# Altium schematic symbol library IC_TI.SCHLIB: 1162 symbols (part 3 of 8) (continued)
## LT1013DDR (continued)

## LT3507AEFE#PBF
designator U?
Integrated Circuit; Manufacturer_Name: Linear Technology; Manufacturer_Part_Number: LT3507AEFE#PBF; Datasheet Link: http://cds.linear.com/docs/en/datasheet/3507af.pdf; Height: 1.2mm; Mouser Part Number: 584-LT3507AEFE#PBF; Mouser Price/Stock: https://www.mouser.com/Search/Refine.aspx?Keyword=584-LT3507AEFE%23PBF
footprint TSSOP38_0.5-PAD
pins: 1 VIN3 (in), 2 SW1_1, 3 SW1_2, 4 BOOST1, 5 VIN1_1 (in), 6 VIN1_2 (in), 7 VINSW (in), 8 OVLO, 9 UVLO, 10 VC1, 11 TRK/SS1, 12 FB1, 13 PG0OD1, 14 PG0OD2, 15 PG0OD3, 16 RT/SYNC, 17 RUN1, 18 RUN2, 19 RUN3, 20 GND (power), 21 BIAS, 22 TRK/SS3, 23 VC3, 24 FB3, 25 TRK/SS2, 26 FB2, 27 NC_1, 28 VC2, 29 DRIVE, 30 FB4, 31 TRK/SS4, 32 BOOST2, 33 SW2, 34 NC_2, 35 VIN2_1 (in), 36 VIN2_2 (in), 37 BOOST3, 38 SW3, 39 EP (power)

## LT8582EDKD#TRPBF
designator U?
Integrated Circuit; Manufacturer_Name: Linear Technology; Manufacturer_Part_Number: LT8582EDKD#TRPBF; Datasheet Link: http://www.analog.com/media/en/technical-documentation/data-sheets/8582f.pdf; Height: 0.8mm; Mouser Part Number: 584-LT8582EDKD#TRPBF; Mouser Price/Stock: https://www.mouser.com/Search/Refine.aspx?Keyword=584-LT8582EDKD%23TRPBF
footprint DFN24_0.5-PAD(7X4)
pins: 1 SWA1, 2 VIN1, 3 PG1, 4 GATE1, 5 VC1, 6 FBX1, 7 FBX2, 8 VC2, 9 GATE2, 10 PG2, 11 VIN2, 12 SWA2, 13 SWB2, 14 CLKOUT2, 15 ~{SHDN2}, 16 RT2, 17 SS2, 18 SYNC2, 19 SYNC1, 20 SS1, 21 RT1, 22 ~{SHDN1}, 23 CLKOUT1, 24 SWB1, 25 EP_(GND)

## MAX232EIDR
designator U?
Integrated Circuit; Manufacturer_Name: Texas Instruments; Manufacturer_Part_Number: MAX232EIDR; Datasheet Link: http://www.ti.com/lit/gpn/max232e; Height: 1.75mm; Mouser Part Number: 595-MAX232EIDR; Mouser Price/Stock: https://www.mouser.com/Search/Refine.aspx?Keyword=595-MAX232EIDR
footprint SOIC16_1.27
pins: 1 C1+ (io), 2 VS+ (io), 3 C1- (io), 4 C2+ (io), 5 C2- (io), 6 VS- (io), 7 DOUT2 (out), 8 RIN2 (in), 9 ROUT2 (out), 10 DIN2 (in), 11 DIN1 (in), 12 ROUT1 (out), 13 RIN1 (in), 14 DOUT1 (out), 15 GND (power), 16 VCC (power)

## MAX660M_NOPB
designator U?
Integrated Circuit; Manufacturer_Name: Texas Instruments; Manufacturer_Part_Number: MAX660M/NOPB; Datasheet Link: http://docs-emea.rs-online.com/webdocs/0b14/0900766b80b146b0.pdf; Height: 1.753mm; Mouser Part Number: 926-MAX660M/NOPB; Mouser Price/Stock: https://www.mouser.com/Search/Refine.aspx?Keyword=926-MAX660M%2FNOPB; RS Part Number: 0460588; RS Price/Stock: http://uk.rs-online.com/web/p/products/0460588
footprint SOIC8_1.27 (SOP, 8-Leads, Pitch 1.27mm)
pins: 1 FC, 2 CAP+, 3 GND (power), 4 CAP-, 5 OUT (out), 6 LV, 7 OSC, 8 V+

## MAX2659ELT+T
designator U?
Integrated Circuit; Manufacturer_Name: Maxim Integrated; Manufacturer_Part_Number: MAX2659ELT+T; Datasheet Link: http://datasheets.maximintegrated.com/en/ds/MAX2659.pdf; Height: 0.8mm; Mouser Part Number: 700-MAX2659ELT+T; Mouser Price/Stock: https://www.mouser.com/Search/Refine.aspx?Keyword=700-MAX2659ELT%2BT; RS Part Number: 9237201; RS Price/Stock: https://uk.rs-online.com/web/p/products/9237201
footprint DFN6_0.5(1.5X1)
pins: 1 GND (power), 2 GND_1 (power), 3 RFIN (in), 4 VCC (power), 5 ~{SHDN}, 6 RFOUT (out)

## MAX3221EIPW
designator U?
Integrated Circuit; Manufacturer_Name: Texas Instruments; Manufacturer_Part_Number: MAX3221EIPW; Datasheet Link: http://www.ti.com/lit/gpn/max3221e; Height: 1.2mm; Mouser Part Number: 595-MAX3221EIPW; Mouser Price/Stock: https://www.mouser.com/Search/Refine.aspx?Keyword=595-MAX3221EIPW; RS Part Number: 6608631P; RS Price/Stock: http://uk.rs-online.com/web/p/products/6608631P
footprint TSSOP16_0.65 (Shrink Small Outline; 16 Leads; Body Width 4.4 mm; Pitch 0.65 mm)
pins: 1 ~{EN}, 2 C1+, 3 V+, 4 C1-, 5 C2+, 6 C2-, 7 V-, 8 RIN, 9 ROUT, 10 ~{INVALID}, 11 DIN, 12 FORCEON, 13 DOUT, 14 GND, 15 VCC, 16 ~{FORCEOFF}

## MAX3221IDBE4
designator U?
Integrated Circuit; Manufacturer_Name: Texas Instruments; Manufacturer_Part_Number: MAX3221IDBE4; Datasheet Link: http://www.ti.com/lit/ds/symlink/max3221.pdf; Height: 2mm; Mouser Part Number: 595-MAX3221IDBE4; Mouser Price/Stock: https://www.mouser.com/Search/Refine.aspx?Keyword=595-MAX3221IDBE4
footprint SSOP16_0.65
pins: 1 ~{EN} (in), 2 C1+, 3 V+ (out), 4 C1-, 5 C2+, 6 C2-, 7 V- (out), 8 RIN (in), 9 ROUT (out), 10 ~{INVALID}, 11 DIN (in), 12 FORCEON (in), 13 DOUT (out), 14 GND (power), 15 VCC (power), 16 ~{FORCEOFF} (in)

## MAX3232CD
designator U?
Integrated Circuit; Manufacturer_Name: Texas Instruments; Manufacturer_Part_Number: MAX3232CD; Datasheet Link: http://www.ti.com/lit/ds/symlink/max3232.pdf; Height: 1.75mm; Mouser Part Number: 595-MAX3232CD; Mouser Price/Stock: https://www.mouser.com/Search/Refine.aspx?Keyword=595-MAX3232CD; RS Part Number: 6608694P; RS Price/Stock: http://uk.rs-online.com/web/p/products/6608694P
footprint SOIC16_1.27
pins: 1 C1+, 2 V+, 3 C1-, 4 C2+, 5 C2-, 6 V-, 7 DOUT2 (out), 8 RIN2 (in), 9 ROUT2 (out), 10 DIN2 (in), 11 DIN1 (in), 12 ROUT1 (out), 13 RIN1 (in), 14 DOUT1 (out), 15 GND (power), 16 VCC (power)

## MAX3232EIPWRQ1
designator U?
Integrated Circuit; Manufacturer_Name: Texas Instruments; Manufacturer_Part_Number: MAX3232EIPWRQ1; Datasheet Link: https://componentsearchengine.com/Datasheets/2/MAX3232EIPWRQ1.pdf; Height: 1.2mm; Mouser Part Number: 595-MAX3232EIPWRQ1; Mouser Price/Stock: https://www.mouser.com/Search/Refine.aspx?Keyword=595-MAX3232EIPWRQ1
footprint TSSOP16_0.65 (Shrink Small Outline; 16 Leads; Body Width 4.4 mm; Pitch 0.65 mm)
pins: 1 C1+, 2 V+, 3 C1-, 4 C2+, 5 C2-, 6 V-, 7 DOUT2, 8 RIN2, 9 ROUT2, 10 DIN2, 11 DIN1, 12 ROUT1, 13 RIN1, 14 DOUT1, 15 GND, 16 VCC

## MAX3243CDB
designator U?
Integrated Circuit; Manufacturer_Name: Texas Instruments; Manufacturer_Part_Number: MAX3243CDB; Datasheet Link: http://www.ti.com/lit/ds/symlink/max3243.pdf; Height: 2mm; Mouser Part Number: 595-MAX3243CDB; Mouser Price/Stock: https://www.mouser.com/Search/Refine.aspx?Keyword=595-MAX3243CDB; RS Part Number: 5170621P; RS Price/Stock: http://uk.rs-online.com/web/p/products/5170621P
footprint SSOP28_0.65
pins: 1 C2+, 2 C2-, 3 V-, 4 RIN1 (in), 5 RIN2 (in), 6 RIN3 (in), 7 RIN4 (in), 8 RIN5 (in), 9 DOUT1 (out), 10 DOUT2 (out), 11 DOUT3 (out), 12 DIN3 (in), 13 DIN2 (in), 14 DIN1 (in), 15 ROUT5 (out), 16 ROUT4 (out), 17 ROUT3 (out), 18 ROUT2 (out), 19 ROUT1 (out), 20 ROUT2B (out), 21 ~{INVALID} (in), 22 ~{FORCEOFF}, 23 FORCEON, 24 C1-, 25 GND (power), 26 VCC (power), 27 V+, 28 C1+

## MAX3243CDW
designator U?
Integrated Circuit; Manufacturer_Name: Texas Instruments; Manufacturer_Part_Number: MAX3243CDW; Datasheet Link: http://www.ti.com/lit/ds/symlink/max3243.pdf; Height: 2.65mm; Mouser Part Number: 595-MAX3243CDW; Mouser Price/Stock: https://www.mouser.com/Search/Refine.aspx?Keyword=595-MAX3243CDW; RS Part Number: 1685138; RS Price/Stock: http://uk.rs-online.com/web/p/products/1685138
footprint SOIC28W_1.27
pins: 1 C2+, 2 C2-, 3 V-, 4 RIN1 (in), 5 RIN2 (in), 6 RIN3 (in), 7 RIN4 (in), 8 RIN5 (in), 9 DOUT1 (out), 10 DOUT2 (out), 11 DOUT3 (out), 12 DIN3 (in), 13 DIN2 (in), 14 DIN1 (in), 15 ROUT5 (out), 16 ROUT4 (out), 17 ROUT3 (out), 18 ROUT2 (out), 19 ROUT1 (out), 20 ROUT2B (out), 21 ~{INVALID} (in), 22 ~{FORCEOFF}, 23 FORCEON, 24 C1-, 25 GND (power), 26 VCC (power), 27 V+, 28 C1+

## MAX3243ECPW
designator U?
Integrated Circuit; Manufacturer_Name: Texas Instruments; Manufacturer_Part_Number: MAX3243ECPW; Datasheet Link: http://www.ti.com/lit/ds/symlink/max3243e.pdf; Height: 1.2mm; Mouser Part Number: 595-MAX3243ECPW; Mouser Price/Stock: https://www.mouser.com/Search/Refine.aspx?Keyword=595-MAX3243ECPW; RS Part Number: 5457697; RS Price/Stock: http://uk.rs-online.com/web/p/products/5457697
footprint TSSOP28_0.65
pins: 1 C2+, 2 C2-, 3 V- (power), 4 RIN1 (in), 5 RIN2 (in), 6 RIN3 (in), 7 RIN4 (in), 8 RIN5 (in), 9 DOUT1 (out), 10 DOUT2 (out), 11 DOUT3 (out), 12 DIN3 (in), 13 DIN2 (in), 14 DIN1 (in), 15 ROUT5 (out), 16 ROUT4 (out), 17 ROUT3 (out), 18 ROUT2 (out), 19 ROUT1 (out), 20 ROUT2B (out), 21 ~{INVALID} (in), 22 ~{FORCEOFF}, 23 FORCEON, 24 C1-, 25 GND (power), 26 VCC (power), 27 V+ (power), 28 C1+

## MC79L05ACD
designator U?
Integrated Circuit; Manufacturer_Name: Texas Instruments; Manufacturer_Part_Number: MC79L05ACD; Datasheet Link: http://www.ti.com/lit/gpn/mc79l; Mouser Part Number: 595-MC79L05ACD; Mouser Price/Stock: https://www.mouser.com/Search/Refine.aspx?Keyword=595-MC79L05ACD; RS Part Number: 1451205; RS Price/Stock: http://uk.rs-online.com/web/p/products/1451205
footprint SOIC8_1.27 (SOP, 8-Leads, Pitch 1.27mm)
pins: 1 OUT, 2 IN+_2, 3 IN+_3, 4 NC_2, 5 COM, 6 IN+, 7 IN+_4, 8 NC

## MC3486D
designator U?
Integrated Circuit; Manufacturer_Name: Texas Instruments; Manufacturer_Part_Number: MC3486D; Datasheet Link: http://uk.rs-online.com/web/p/products/1625175; Height: 1.75mm; Mouser Part Number: 595-MC3486D; Mouser Price/Stock: https://www.mouser.com/Search/Refine.aspx?Keyword=595-MC3486D; RS Part Number: 1625175; RS Price/Stock: http://uk.rs-online.com/web/p/products/1625175
footprint SOIC16_1.27
pins: 1 1B, 2 1A, 3 1Y, 4 1,2EN, 5 2Y, 6 2A, 7 2B, 8 GND, 9 3B, 10 3A, 11 3Y, 12 3,4EN, 13 4Y, 14 4A, 15 4B, 16 VCC

## MC3486NE4
designator U?
Integrated Circuit; Manufacturer_Name: Texas Instruments; Manufacturer_Part_Number: MC3486NE4; Datasheet Link: http://www.ti.com/general/docs/lit/getliterature.tsp?genericPartNumber=MC3486&&fileType=pdf; Height: 5.08mm; Mouser Part Number: 595-MC3486NE4; Mouser Price/Stock: https://www.mouser.com/Search/Refine.aspx?Keyword=595-MC3486NE4
footprint DIP16-A
pins: 1 1B, 2 1A, 3 1Y, 4 1,_2EN, 5 2Y, 6 2A, 7 2B, 8 GND, 9 3B, 10 3A, 11 3Y, 12 3,_4EN, 13 4Y, 14 4A, 15 4B, 16 VCC

## MC3487D
designator U?
Integrated Circuit; Manufacturer_Name: Texas Instruments; Manufacturer_Part_Number: MC3487D; Datasheet Link: http://www.ti.com/lit/ds/symlink/mc3487.pdf; Height: 1.75mm; RS Part Number: 5172920P; RS Price/Stock: http://uk.rs-online.com/web/p/products/5172920P
footprint SOIC16_1.27
pins: 1 1A, 2 1Y, 3 1Z, 4 1,2EN, 5 2Z, 6 2Y, 7 2A, 8 GND (power), 9 3A, 10 3Y, 11 3Z, 12 3,4EN, 13 4Z, 14 4Y, 15 4A, 16 VCC (power)

## MC3487N
designator U?
Integrated Circuit; Manufacturer_Name: Texas Instruments; Manufacturer_Part_Number: MC3487N; Datasheet Link: http://www.ti.com/lit/gpn/mc3487; Mouser Part Number: 595-MC3487N; RS Part Number: 2507749; RS Price/Stock: http://uk.rs-online.com/web/p/products/2507749
footprint DIP16
pins: 1 1A, 2 1Y, 3 1Z, 4 1,2EN, 5 2Z, 6 2Y, 7 2A, 8 GND, 9 3A, 10 3Y, 11 3Z, 12 3,4EN, 13 4Z, 14 4Y, 15 4A, 16 VCC

## MC33063AP
designator U?
Integrated Circuit; Manufacturer_Name: Texas Instruments; Manufacturer_Part_Number: MC33063AP; Datasheet Link: http://www.ti.com/lit/ds/symlink/mc33063a.pdf; Height: 5.08mm; Mouser Part Number: 595-MC33063AP; Mouser Price/Stock: https://www.mouser.com/Search/Refine.aspx?Keyword=595-MC33063AP; RS Part Number: 6618433; RS Price/Stock: http://uk.rs-online.com/web/p/products/6618433
footprint DIP8-A
pins: 1 SWITCH_COLLECTOR, 2 SWITCH_EMITTER, 3 TIMING_CAPACITOR (in), 4 GND (power), 5 COMPARATOR_INVERTING_INPUT (in), 6 VCC (power), 7 IPK, 8 DRIVER_COLLECTOR

## MC33063AQDRQ1
designator U?
Integrated Circuit; Manufacturer_Name: Texas Instruments; Manufacturer_Part_Number: MC33063AQDRQ1; Datasheet Link: http://www.ti.com/lit/gpn/mc33063a-q1; Height: 1.75mm; Mouser Part Number: 595-MC33063AQDRQ1; Mouser Price/Stock: https://www.mouser.com/Search/Refine.aspx?Keyword=595-MC33063AQDRQ1
footprint SOIC8_1.27 (SOP, 8-Leads, Pitch 1.27mm)
pins: 1 SWITCH_COLLECTOR, 2 SWITCH_EMITTER, 3 TIMING_CAPACITOR, 4 GND, 5 COMPARATOR_INVERTING_INPUT, 6 VCC, 7 IPK, 8 DRIVER_COLLECTOR

## MC34063AP
designator U?
Integrated Circuit; Manufacturer_Name: Texas Instruments; Manufacturer_Part_Number: MC34063AP; Datasheet Link: http://www.ti.com/lit/ds/symlink/mc33063a.pdf; Height: 5.08mm; Mouser Part Number: 595-MC34063AP; Mouser Price/Stock: https://www.mouser.com/Search/Refine.aspx?Keyword=595-MC34063AP; RS Part Number: 9223669; RS Price/Stock: http://uk.rs-online.com/web/p/products/9223669
footprint DIP8-A
pins: 1 SWITCH_COLLECTOR, 2 SWITCH_EMITTER, 3 TIMING_CAPACITOR (in), 4 GND (power), 5 COMPARATOR_INVERTING_INPUT (in), 6 VCC (power), 7 IPK, 8 DRIVER_COLLECTOR

## MC34063EBD-TR
designator U?
Integrated Circuit; Manufacturer_Name: STMicroelectronics; Manufacturer_Part_Number: MC34063EBD-TR; Datasheet Link: http://docs-emea.rs-online.com/webdocs/13e5/0900766b813e5571.pdf; Height: 1.75mm; Mouser Part Number: 511-MC34063EBD-TR; Mouser Price/Stock: https://www.mouser.com/Search/Refine.aspx?Keyword=511-MC34063EBD-TR; RS Part Number: 1655568; RS Price/Stock: http://uk.rs-online.com/web/p/products/1655568
footprint SOIC8_1.27 (SOP, 8-Leads, Pitch 1.27mm)
pins: 1 SWC, 2 SWE, 3 TC, 4 GND (power), 5 CII, 6 VCC (power), 7 IPK, 8 DRC

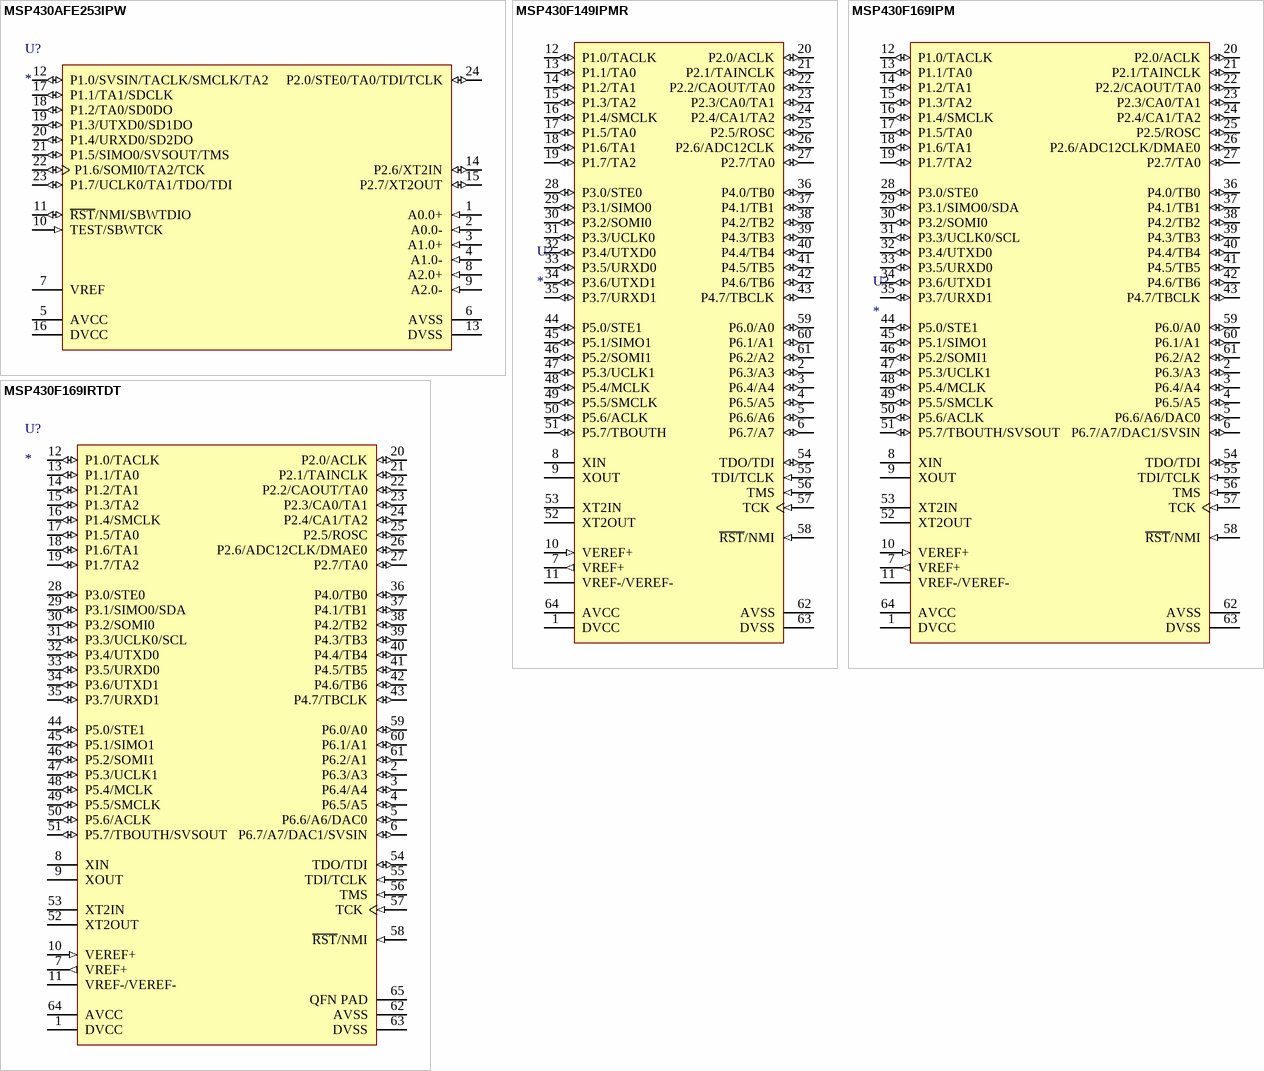
[diagram p12: symbols MSP430AFE253IPW to MSP430F169IRTDT]

## MSP430AFE253IPW
designator U?
Integrated Circuit; Manufacturer_Name: Texas Instruments; Manufacturer_Part_Number: MSP430AFE253IPW; Datasheet Link: https://componentsearchengine.com/Datasheets/2/MSP430AFE253IPW.pdf; Height: 1.2mm; Mouser Part Number: 595-MSP430AFE253IPW; Mouser Price/Stock: https://www.mouser.com/Search/Refine.aspx?Keyword=595-MSP430AFE253IPW; RS Part Number: 9215289; RS Price/Stock: http://uk.rs-online.com/web/p/products/9215289
footprint TSSOP24_0.65 (TSOP, 24-Leads, Body 7.80x4.40mm, Pitch 0.65mm, Thermal Pad 5.16x2.40mm, IPC Low Density)
pins: 1 A0.0+ (in) "SD24_A positive analog input A0.0", 2 A0.0- (in) "SD24_A negative analog input A0.0", 3 A1.0+ (in) "SD24_A positive analog input A1.0 (not available on MSP430AFE2x1)", 4 A1.0- (in) "SD24_A negative analog input A1.0 (not available on MSP430AFE2x1)", 5 AVCC (power) "Analog supply voltage, positive terminal. Must not power up prior to DVCC.", 6 AVSS (power) "Analog supply voltage, negative terminal", 7 VREF "Input for an external reference voltage/ output for internal reference voltage (can be used as mid-voltage)", 8 A2.0+ (in) "SD24_A positive analog input A2.0 (not available on MSP430AFE2x2 and MSP430AFE2x1)", 9 A2.0- (in) "SD24_A negative analog input A2.0 (not available on MSP430AFE2x2 and MSP430AFE2x1)", 10 TEST/SBWTCK (in) "Digital supply voltage, negative terminal", 11 ~{RST}/NMI/SBWTDIO (io), 12 P1.0/SVSIN/TACLK/SMCLK/TA2 (io), 13 DVSS (power) "Digital supply voltage, negative terminal", 14 P2.6/XT2IN (io), 15 P2.7/XT2OUT (io), 16 DVCC (power) "Digital supply voltage, positive terminal.", 17 P1.1/TA1/SDCLK (io), 18 P1.2/TA0/SD0DO (io), 19 P1.3/UTXD0/SD1DO (io), 20 P1.4/URXD0/SD2DO (io), 21 P1.5/SIMO0/SVSOUT/TMS (io), 22 P1.6/SOMI0/TA2/TCK (io), 23 P1.7/UCLK0/TA1/TDO/TDI (io), 24 P2.0/STE0/TA0/TDI/TCLK (io) "Input for an external reference voltage/ output for internal reference voltage (can be used as mid-voltage)"

## MSP430F149IPMR
designator U?
Integrated Circuit; Manufacturer_Name: Texas Instruments; Manufacturer_Part_Number: MSP430F149IPMR; Datasheet Link: http://www.ti.com/lit/ds/symlink/msp430f149.pdf; Height: 1.6mm; Mouser Part Number: 595-430F149IPMR; Mouser Price/Stock: https://www.mouser.com/Search/Refine.aspx?Keyword=595-430F149IPMR; RS Part Number: 6624043P; RS Price/Stock: http://uk.rs-online.com/web/p/products/6624043P
footprint LQFP64_0.5MM
pins: 1 DVCC (power) "Digital supply voltage, positive terminal. Supplies all digital parts.", 2 P6.3/A3 (io), 3 P6.4/A4 (io), 4 P6.5/A5 (io), 5 P6.6/A6 (io), 6 P6.7/A7 (io), 7 VREF+ (out) "Output of positive terminal of the reference voltage in the ADC", 8 XIN "Input port for crystal oscillator XT1. Standard or watch crystals can be connected.", 9 XOUT "Output terminal of crystal oscillator XT1", 10 VEREF+ (in) "Input for an external reference voltage to the ADC", 11 VREF-/VEREF-, 12 P1.0/TACLK (io), 13 P1.1/TA0 (io), 14 P1.2/TA1 (io), 15 P1.3/TA2 (io), 16 P1.4/SMCLK (io), 17 P1.5/TA0 (io), 18 P1.6/TA1 (io), 19 P1.7/TA2 (io), 20 P2.0/ACLK (io), 21 P2.1/TAINCLK (io), 22 P2.2/CAOUT/TA0 (io), 23 P2.3/CA0/TA1 (io), 24 P2.4/CA1/TA2 (io), 25 P2.5/ROSC (io), 26 P2.6/ADC12CLK (io), 27 P2.7/TA0 (io), 28 P3.0/STE0 (io), 29 P3.1/SIMO0 (io), 30 P3.2/SOMI0 (io), 31 P3.3/UCLK0 (io), 32 P3.4/UTXD0 (io), 33 P3.5/URXD0 (io), 34 P3.6/UTXD1 (io), 35 P3.7/URXD1 (io), 36 P4.0/TB0 (io), 37 P4.1/TB1 (io), 38 P4.2/TB2 (io), 39 P4.3/TB3 (io), 40 P4.4/TB4 (io), 41 P4.5/TB5 (io), 42 P4.6/TB6 (io), 43 P4.7/TBCLK (io), 44 P5.0/STE1 (io), 45 P5.1/SIMO1 (io), 46 P5.2/SOMI1 (io), 47 P5.3/UCLK1 (io), 48 P5.4/MCLK (io), 49 P5.5/SMCLK (io), 50 P5.6/ACLK (io), 51 P5.7/TBOUTH (io), 52 XT2OUT "Output terminal of crystal oscillator XT2", 53 XT2IN "Input port for crystal oscillator XT2. Only standard crystals can be connected.", 54 TDO/TDI (io), 55 TDI/TCLK (in), 56 TMS (in) "Test mode select. TMS is used as an input port for device programming and test.", 57 TCK (in) "Test clock. TCK is the clock input port for device programming test and bootstrap loader start (in Flash devices).", 58 ~{RST}/NMI (in), 59 P6.0/A0 (io), 60 P6.1/A1 (io), 61 P6.2/A2 (io), 62 AVSS (power) "Analog supply voltage, negative terminal. Supplies the analog portion of the analog-to-digital converter.", 63 DVSS (power) "Digital supply voltage, negative terminal. Supplies all digital parts.", 64 AVCC (power) "Analog supply voltage, positive terminal. Supplies the analog portion of the analog-to-digital converter."

## MSP430F169IPM
designator U?
Integrated Circuit; Manufacturer_Name: Texas Instruments; Manufacturer_Part_Number: MSP430F169IPM; Datasheet Link: http://www.ti.com/lit/ds/symlink/msp430f169.pdf; Height: 1.6mm; Mouser Part Number: 595-430F169IPM; Mouser Price/Stock: https://www.mouser.com/Search/Refine.aspx?Keyword=595-430F169IPM; RS Part Number: 6195794P; RS Price/Stock: http://uk.rs-online.com/web/p/products/6195794P
footprint LQFP64_0.5MM
pins: 1 DVCC (power) "Digital supply voltage, positive terminal. Supplies all digital parts.", 2 P6.3/A3 (io), 3 P6.4/A4 (io), 4 P6.5/A5 (io), 5 P6.6/A6/DAC0 (io), 6 P6.7/A7/DAC1/SVSIN (io), 7 VREF+ (out) "Output of positive terminal of the reference voltage in the ADC12", 8 XIN "Input port for crystal oscillator XT1. Standard or watch crystals can be connected.", 9 XOUT "Output terminal of crystal oscillator XT1", 10 VEREF+ (in) "Input for an external reference voltage", 11 VREF-/VEREF-, 12 P1.0/TACLK (io), 13 P1.1/TA0 (io), 14 P1.2/TA1 (io), 15 P1.3/TA2 (io), 16 P1.4/SMCLK (io), 17 P1.5/TA0 (io), 18 P1.6/TA1 (io), 19 P1.7/TA2 (io), 20 P2.0/ACLK (io), 21 P2.1/TAINCLK (io), 22 P2.2/CAOUT/TA0 (io), 23 P2.3/CA0/TA1 (io), 24 P2.4/CA1/TA2 (io), 25 P2.5/ROSC (io), 26 P2.6/ADC12CLK/DMAE0 (io), 27 P2.7/TA0 (io), 28 P3.0/STE0 (io), 29 P3.1/SIMO0/SDA (io), 30 P3.2/SOMI0 (io), 31 P3.3/UCLK0/SCL (io), 32 P3.4/UTXD0 (io), 33 P3.5/URXD0 (io), 34 P3.6/UTXD1 (io), 35 P3.7/URXD1 (io), 36 P4.0/TB0 (io), 37 P4.1/TB1 (io), 38 P4.2/TB2 (io), 39 P4.3/TB3 (io), 40 P4.4/TB4 (io), 41 P4.5/TB5 (io), 42 P4.6/TB6 (io), 43 P4.7/TBCLK (io), 44 P5.0/STE1 (io), 45 P5.1/SIMO1 (io), 46 P5.2/SOMI1 (io), 47 P5.3/UCLK1 (io), 48 P5.4/MCLK (io), 49 P5.5/SMCLK (io), 50 P5.6/ACLK (io), 51 P5.7/TBOUTH/SVSOUT (io), 52 XT2OUT "Output terminal of crystal oscillator XT2", 53 XT2IN "Input port for crystal oscillator XT2. Only standard crystals can be connected.", 54 TDO/TDI (io), 55 TDI/TCLK (in), 56 TMS (in) "Test mode select. TMS is used as an input port for device programming and test.", 57 TCK (in) "Test clock. TCK is the clock input port for device programming test and bootstrap loader start", 58 ~{RST}/NMI (in), 59 P6.0/A0 (io), 60 P6.1/A1 (io), 61 P6.2/A2 (io), 62 AVSS (power) "Analog supply voltage, negative terminal. Supplies only the analog portion of ADC12 and DAC12.", 63 DVSS (power) "Digital supply voltage, negative terminal. Supplies all digital parts.", 64 AVCC (power) "Analog supply voltage, positive terminal. Supplies only the analog portion of ADC12 and DAC12"

## MSP430F169IRTDT
designator U?
Integrated Circuit; Manufacturer_Name: Texas Instruments; Manufacturer_Part_Number: MSP430F169IRTDT; Datasheet Link: http://www.ti.com/lit/ds/symlink/msp430f169.pdf; Height: 0.9mm; Mouser Part Number: 595-MSP430F169IRTDT; Mouser Price/Stock: https://www.mouser.com/Search/Refine.aspx?Keyword=595-MSP430F169IRTDT; RS Part Number: 7098969P; RS Price/Stock: http://uk.rs-online.com/web/p/products/7098969P
footprint QFN64_0.5-PAD(9X9)
pins: 1 DVCC (power) "Digital supply voltage, positive terminal. Supplies all digital parts.", 2 P6.3/A3 (io), 3 P6.4/A4 (io), 4 P6.5/A5 (io), 5 P6.6/A6/DAC0 (io), 6 P6.7/A7/DAC1/SVSIN (io), 7 VREF+ (out) "Output of positive terminal of the reference voltage in the ADC12", 8 XIN "Input port for crystal oscillator XT1. Standard or watch crystals can be connected.", 9 XOUT "Output terminal of crystal oscillator XT1", 10 VEREF+ (in) "Input for an external reference voltage", 11 VREF-/VEREF-, 12 P1.0/TACLK (io), 13 P1.1/TA0 (io), 14 P1.2/TA1 (io), 15 P1.3/TA2 (io), 16 P1.4/SMCLK (io), 17 P1.5/TA0 (io), 18 P1.6/TA1 (io), 19 P1.7/TA2 (io), 20 P2.0/ACLK (io), 21 P2.1/TAINCLK (io), 22 P2.2/CAOUT/TA0 (io), 23 P2.3/CA0/TA1 (io), 24 P2.4/CA1/TA2 (io), 25 P2.5/ROSC (io), 26 P2.6/ADC12CLK/DMAE0 (io), 27 P2.7/TA0 (io), 28 P3.0/STE0 (io), 29 P3.1/SIMO0/SDA (io), 30 P3.2/SOMI0 (io), 31 P3.3/UCLK0/SCL (io), 32 P3.4/UTXD0 (io), 33 P3.5/URXD0 (io), 34 P3.6/UTXD1 (io), 35 P3.7/URXD1 (io), 36 P4.0/TB0 (io), 37 P4.1/TB1 (io), 38 P4.2/TB2 (io), 39 P4.3/TB3 (io), 40 P4.4/TB4 (io), 41 P4.5/TB5 (io), 42 P4.6/TB6 (io), 43 P4.7/TBCLK (io), 44 P5.0/STE1 (io), 45 P5.1/SIMO1 (io), 46 P5.2/SOMI1 (io), 47 P5.3/UCLK1 (io), 48 P5.4/MCLK (io), 49 P5.5/SMCLK (io), 50 P5.6/ACLK (io), 51 P5.7/TBOUTH/SVSOUT (io), 52 XT2OUT "Output terminal of crystal oscillator XT2", 53 XT2IN "Input port for crystal oscillator XT2. Only standard crystals can be connected.", 54 TDO/TDI (io), 55 TDI/TCLK (in), 56 TMS (in) "Test mode select. TMS is used as an input port for device programming and test.", 57 TCK (in) "Test clock. TCK is the clock input port for device programming test and bootstrap loader start", 58 ~{RST}/NMI (in), 59 P6.0/A0 (io), 60 P6.1/A1 (io), 61 P6.2/A1 (io), 62 AVSS (power) "Analog supply voltage, negative terminal. Supplies only the analog portion of ADC12 and DAC12.", 63 DVSS (power) "Digital supply voltage, negative terminal. Supplies all digital parts.", 64 AVCC (power) "Analog supply voltage, positive terminal. Supplies only the analog portion of ADC12 and DAC12.", 65 QFN PAD (power) "QFN package pad connection to DVSS recommended (RTD package only)"

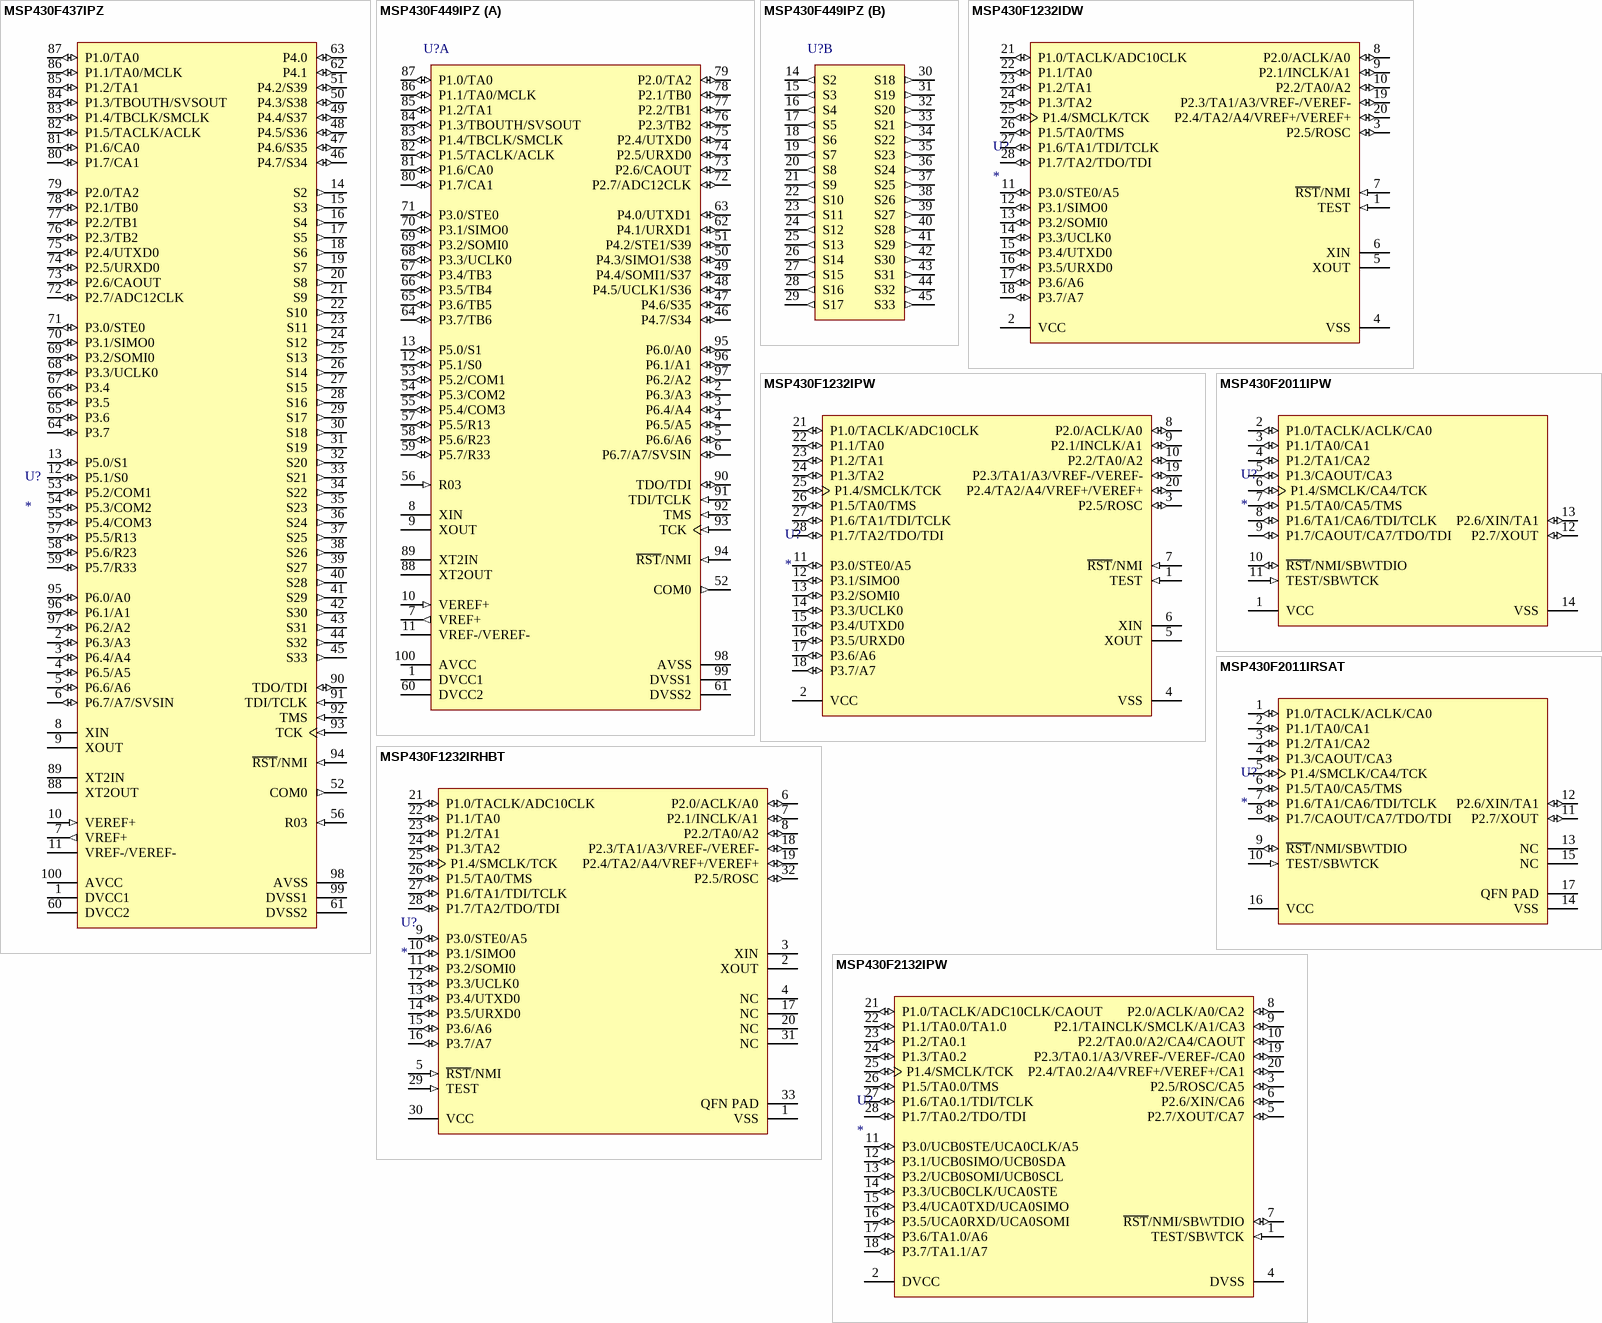
[diagram p13: symbols MSP430F437IPZ to MSP430F2132IPW]

## MSP430F437IPZ
designator U?
Integrated Circuit; Manufacturer_Name: Texas Instruments; Manufacturer_Part_Number: MSP430F437IPZ; Datasheet Link: http://docs-emea.rs-online.com/webdocs/0aa3/0900766b80aa3e7c.pdf; Height: 1.6mm; RS Part Number: 218349
footprint LQFP100_0.5MM
pins: 1 DVCC1 (power) "Digital supply voltage, positive terminal.", 2 P6.3/A3 (io), 3 P6.4/A4 (io), 4 P6.5/A5 (io), 5 P6.6/A6 (io), 6 P6.7/A7/SVSIN (io), 7 VREF+ (out) "Output of positive terminal of the reference voltage in the ADC", 8 XIN "Input port for crystal oscillator XT1. Standard or watch crystals can be connected.", 9 XOUT "Output terminal of crystal oscillator XT1", 10 VEREF+ (in) "Input for an external reference voltage to the ADC", 11 VREF-/VEREF-, 12 P5.1/S0 (io), 13 P5.0/S1 (io), 14 S2 (out) "LCD segment output 2", 15 S3 (out) "LCD segment output 3", 16 S4 (out) "LCD segment output 4", 17 S5 (out) "LCD segment output 5", 18 S6 (out) "LCD segment output 6", 19 S7 (out) "LCD segment output 7", 20 S8 (out) "LCD segment output 8", 21 S9 (out) "LCD segment output 9", 22 S10 (out) "LCD segment output 10", 23 S11 (out) "LCD segment output 11", 24 S12 (out) "LCD segment output 12", 25 S13 (out) "LCD segment output 13", 26 S14 (out) "LCD segment output 14", 27 S15 (out) "LCD segment output 15", 28 S16 (out) "LCD segment output 16", 29 S17 (out) "LCD segment output 17", 30 S18 (out) "LCD segment output 18", 31 S19 (out) "LCD segment output 19", 32 S20 (out) "LCD segment output 20", 33 S21 (out) "LCD segment output 21", 34 S22 (out) "LCD segment output 22", 35 S23 (out) "LCD segment output 23", 36 S24 (out) "LCD segment output 24", 37 S25 (out) "LCD segment output 25", 38 S26 (out) "LCD segment output 26", 39 S27 (out) "LCD segment output 27", 40 S28 (out) "LCD segment output 28", 41 S29 (out) "LCD segment output 29", 42 S30 (out) "LCD segment output 30", 43 S31 (out) "LCD segment output 31", 44 S32 (out) "LCD segment output 32", 45 S33 (out) "LCD segment output 33", 46 P4.7/S34 (io), 47 P4.6/S35 (io), 48 P4.5/S36 (io), 49 P4.4/S37 (io), 50 P4.3/S38 (io), 51 P4.2/S39 (io), 52 COM0 (out) "COM0?3 are used for LCD backplanes.", 53 P5.2/COM1 (io), 54 P5.3/COM2 (io), 55 P5.4/COM3 (io), 56 R03 (in) "Input port of fourth positive (lowest) analog LCD level (V5)", 57 P5.5/R13 (io), 58 P5.6/R23 (io), 59 P5.7/R33 (io), 60 DVCC2 (power) "Digital supply voltage, positive terminal.", 61 DVSS2 (power) "Digital supply voltage, negative terminal.", 62 P4.1 (io) "General-purpose digital I/O", 63 P4.0 (io) "General-purpose digital I/O", 64 P3.7 (io) "General-purpose digital I/O", 65 P3.6 (io) "General-purpose digital I/O", 66 P3.5 (io) "General-purpose digital I/O", 67 P3.4 (io) "General-purpose digital I/O", 68 P3.3/UCLK0 (io), 69 P3.2/SOMI0 (io), 70 P3.1/SIMO0 (io), 71 P3.0/STE0 (io), 72 P2.7/ADC12CLK (io), 73 P2.6/CAOUT (io), 74 P2.5/URXD0 (io), 75 P2.4/UTXD0 (io), 76 P2.3/TB2 (io), 77 P2.2/TB1 (io), 78 P2.1/TB0 (io), 79 P2.0/TA2 (io), 80 P1.7/CA1 (io), 81 P1.6/CA0 (io), 82 P1.5/TACLK/ACLK (io), 83 P1.4/TBCLK/SMCLK (io), 84 P1.3/TBOUTH/SVSOUT (io), 85 P1.2/TA1 (io), 86 P1.1/TA0/MCLK (io), 87 P1.0/TA0 (io), 88 XT2OUT "Output terminal of crystal oscillator XT2", 89 XT2IN "Input port for crystal oscillator XT2. Only standard crystals can be connected.", 90 TDO/TDI (io), 91 TDI/TCLK (in), 92 TMS (in) "Test mode select. TMS is used as an input port for device programming and test.", 93 TCK (in) "Test clock. TCK is the clock input port for device programming and test.", 94 ~{RST}/NMI (in), 95 P6.0/A0 (io), 96 P6.1/A1 (io), 97 P6.2/A2 (io), 98 AVSS (power) "Analog supply voltage, negative terminal. Supplies SVS, brownout, oscillator, comparator_A, ADC12, port 1, and LCD resistive divider circuitry.", 99 DVSS1 (power) "Digital supply voltage, negative terminal.", 100 AVCC (power) "Analog supply voltage, positive terminal. Supplies SVS, brownout, oscillator, comparator_A, ADC12, port 1, and LCD resistive divider circuitry; must not power up prior to DVCC1/DVCC2."

## MSP430F449IPZ
designator U?
8 MHz Mixed Signal Microcontroller with 60 KB Flash, 2048 B SRAM and 48 GPIOs, -40 to 85 degC, 100-pin QFP (PZ), Green (RoHS & no Sb/Br); Manufacturer: Texas Instruments; PartNumber: MSP430F449IPZ; ADC: 12-bit SAR; Brown Out Reset: Yes; Flash(KB): 60; Frequency(MHz): 8; GPIO: 48; LCD Segments: 160; Multiplier: 16x16; SRAM(B): 2048; SubFamily: 4 Series with LCD; USART: 2; DatasheetVersion: SLAS344G; PackageVersion: 4040149/B; PackageReference: PZ100; PackageDescription: 100-Pin Plastic Flat Pack, Body 14 x 14 mm, Pitch 0.5 mm; Comparators: Yes; Eco-Plan: Green (RoHS & no Sb/Br); SVS: Yes; Temp Sensor: Yes; Watchdog: Yes; Mounting Technology: Surface Mount; Code_JEDEC: MS-026; ComponentLink1Description: Manufacturer URL; ComponentLink1URL: http://www.ti.com/; ComponentLink2Description: Datasheet; ComponentLink2URL: http://www.ti.com/general/docs/lit/getliterature.tsp?genericPartNumber=MSP430F449&fileType=pdf; ComponentLink3Description: Package Specification; ComponentLink3URL: http://www.ti.com/lit/ml/mtqf013a/mtqf013a.pdf
footprint LQFP100_0.5MM
part A pins: 1 DVCC1 (power) "Digital supply voltage, positive terminal.", 2 P6.3/A3 (io), 3 P6.4/A4 (io), 4 P6.5/A5 (io), 5 P6.6/A6 (io), 6 P6.7/A7/SVSIN (io), 7 VREF+ (out) "Output of positive terminal of the reference voltage in the ADC", 8 XIN "Input port for crystal oscillator XT1. Standard or watch crystals can be connected.", 9 XOUT "Output terminal of crystal oscillator XT1", 10 VEREF+ (in) "Input for an external reference voltage to the ADC", 11 VREF-/VEREF-, 12 P5.1/S0 (io), 13 P5.0/S1 (io), 46 P4.7/S34 (io), 47 P4.6/S35 (io), 48 P4.5/UCLK1/S36 (io), 49 P4.4/SOMI1/S37 (io), 50 P4.3/SIMO1/S38 (io), 51 P4.2/STE1/S39 (io), 52 COM0 (out) "COM0-3 are used for LCD backplanes.", 53 P5.2/COM1 (io), 54 P5.3/COM2 (io), 55 P5.4/COM3 (io), 56 R03 (in) "Input port of fourth positive (lowest) analog LCD level (V5)", 57 P5.5/R13 (io), 58 P5.6/R23 (io), 59 P5.7/R33 (io), 60 DVCC2 (power) "Digital supply voltage, positive terminal.", 61 DVSS2 (power) "Digital supply voltage, negative terminal.", 62 P4.1/URXD1 (io), 63 P4.0/UTXD1 (io), 64 P3.7/TB6 (io), 65 P3.6/TB5 (io), 66 P3.5/TB4 (io), 67 P3.4/TB3 (io), 68 P3.3/UCLK0 (io), 69 P3.2/SOMI0 (io), 70 P3.1/SIMO0 (io), 71 P3.0/STE0 (io), 72 P2.7/ADC12CLK (io), 73 P2.6/CAOUT (io), 74 P2.5/URXD0 (io), 75 P2.4/UTXD0 (io), 76 P2.3/TB2 (io), 77 P2.2/TB1 (io), 78 P2.1/TB0 (io), 79 P2.0/TA2 (io), 80 P1.7/CA1 (io), 81 P1.6/CA0 (io), 82 P1.5/TACLK/ACLK (io), 83 P1.4/TBCLK/SMCLK (io), 84 P1.3/TBOUTH/SVSOUT (io), 85 P1.2/TA1 (io), 86 P1.1/TA0/MCLK (io), 87 P1.0/TA0 (io), 88 XT2OUT "Output terminal of crystal oscillator XT2", 89 XT2IN "Input port for crystal oscillator XT2. Only standard crystals can be connected.", 90 TDO/TDI (io), 91 TDI/TCLK (in), 92 TMS (in) "Test mode select. TMS is used as an input port for device programming and test.", 93 TCK (in) "Test clock. TCK is the clock input port for device programming and test.", 94 ~{RST}/NMI (in), 95 P6.0/A0 (io), 96 P6.1/A1 (io), 97 P6.2/A2 (io), 98 AVSS (power) "Analog supply voltage, negative terminal. Supplies SVS, brownout, oscillator, comparator_A, ADC12, port 1, and LCD resistive divider circuitry.", 99 DVSS1 (power) "Digital supply voltage, negative terminal.", 100 AVCC (power) "Analog supply voltage, positive terminal. Supplies SVS, brownout, oscillator, comparator_A, ADC12, port 1, and LCD resistive divider circuitry; must not power up prior to DVCC1/DVCC2."
part B pins: 14 S2 (out) "LCD segment output 2", 15 S3 (out) "LCD segment output 3", 16 S4 (out) "LCD segment output 4", 17 S5 (out) "LCD segment output 5", 18 S6 (out) "LCD segment output 6", 19 S7 (out) "LCD segment output 7", 20 S8 (out) "LCD segment output 8", 21 S9 (out) "LCD segment output 9", 22 S10 (out) "LCD segment output 10", 23 S11 (out) "LCD segment output 11", 24 S12 (out) "LCD segment output 12", 25 S13 (out) "LCD segment output 13", 26 S14 (out) "LCD segment output 14", 27 S15 (out) "LCD segment output 15", 28 S16 (out) "LCD segment output 16", 29 S17 (out) "LCD segment output 17", 30 S18 (out) "LCD segment output 18", 31 S19 (out) "LCD segment output 19", 32 S20 (out) "LCD segment output 20", 33 S21 (out) "LCD segment output 21", 34 S22 (out) "LCD segment output 22", 35 S23 (out) "LCD segment output 23", 36 S24 (out) "LCD segment output 24", 37 S25 (out) "LCD segment output 25", 38 S26 (out) "LCD segment output 26", 39 S27 (out) "LCD segment output 27", 40 S28 (out) "LCD segment output 28", 41 S29 (out) "LCD segment output 29", 42 S30 (out) "LCD segment output 30", 43 S31 (out) "LCD segment output 31", 44 S32 (out) "LCD segment output 32", 45 S33 (out) "LCD segment output 33"

## MSP430F1232IDW
designator U?
Integrated Circuit; Manufacturer_Name: Texas Instruments; Manufacturer_Part_Number: MSP430F1232IDW; Datasheet Link: http://www.ti.com/lit/ds/symlink/msp430f1232.pdf; Height: 2.65mm; Mouser Part Number: 595-430F1232IDW; Mouser Price/Stock: https://www.mouser.com/Search/Refine.aspx?Keyword=595-430F1232IDW; RS Part Number: 1624827; RS Price/Stock: http://uk.rs-online.com/web/p/products/1624827
footprint SOIC28W_1.27
pins: 1 TEST (in) "Selects test mode for JTAG pins on P1.x", 2 VCC (power) "Supply voltage", 3 P2.5/ROSC (io), 4 VSS (power) "Ground reference", 5 XOUT "Output terminal of crystal oscillator", 6 XIN "Input terminal of crystal oscillator", 7 ~{RST}/NMI (in), 8 P2.0/ACLK/A0 (io), 9 P2.1/INCLK/A1 (io), 10 P2.2/TA0/A2 (io), 11 P3.0/STE0/A5 (io), 12 P3.1/SIMO0 (io), 13 P3.2/SOMI0 (io), 14 P3.3/UCLK0 (io), 15 P3.4/UTXD0 (io), 16 P3.5/URXD0 (io), 17 P3.6/A6 (io), 18 P3.7/A7 (io), 19 P2.3/TA1/A3/VREF-/VEREF- (io), 20 P2.4/TA2/A4/VREF+/VEREF+ (io), 21 P1.0/TACLK/ADC10CLK (io), 22 P1.1/TA0 (io), 23 P1.2/TA1 (io), 24 P1.3/TA2 (io), 25 P1.4/SMCLK/TCK (io), 26 P1.5/TA0/TMS (io), 27 P1.6/TA1/TDI/TCLK (io), 28 P1.7/TA2/TDO/TDI (io)

## MSP430F1232IPW
designator U?
Integrated Circuit; Manufacturer_Name: Texas Instruments; Manufacturer_Part_Number: MSP430F1232IPW; Datasheet Link: http://www.ti.com/lit/ds/symlink/msp430f1232.pdf; Height: 1.2mm; Mouser Part Number: 595-430F1232IPW; Mouser Price/Stock: https://www.mouser.com/Search/Refine.aspx?Keyword=595-430F1232IPW; RS Part Number: 6195766P; RS Price/Stock: http://uk.rs-online.com/web/p/products/6195766P
footprint TSSOP28_0.65
pins: 1 TEST (in) "Selects test mode for JTAG pins on P1.x", 2 VCC (power) "Supply voltage", 3 P2.5/ROSC (io), 4 VSS (power) "Ground reference", 5 XOUT "Output terminal of crystal oscillator", 6 XIN "Input terminal of crystal oscillator", 7 ~{RST}/NMI (in), 8 P2.0/ACLK/A0 (io), 9 P2.1/INCLK/A1 (io), 10 P2.2/TA0/A2 (io), 11 P3.0/STE0/A5 (io), 12 P3.1/SIMO0 (io), 13 P3.2/SOMI0 (io), 14 P3.3/UCLK0 (io), 15 P3.4/UTXD0 (io), 16 P3.5/URXD0 (io), 17 P3.6/A6 (io), 18 P3.7/A7 (io), 19 P2.3/TA1/A3/VREF-/VEREF- (io), 20 P2.4/TA2/A4/VREF+/VEREF+ (io), 21 P1.0/TACLK/ADC10CLK (io), 22 P1.1/TA0 (io), 23 P1.2/TA1 (io), 24 P1.3/TA2 (io), 25 P1.4/SMCLK/TCK (io), 26 P1.5/TA0/TMS (io), 27 P1.6/TA1/TDI/TCLK (io), 28 P1.7/TA2/TDO/TDI (io)

## MSP430F1232IRHBT
designator U?
Integrated Circuit; Manufacturer_Name: Texas Instruments; Manufacturer_Part_Number: MSP430F1232IRHBT; Datasheet Link: http://www.ti.com/lit/ds/symlink/msp430f1232.pdf; Height: 1mm; Mouser Part Number: 595-430F1232IRHBT; Mouser Price/Stock: https://www.mouser.com/Search/Refine.aspx?Keyword=595-430F1232IRHBT; RS Part Number: 7098739P; RS Price/Stock: http://uk.rs-online.com/web/p/products/7098739P
footprint QFN32_0.5-PAD(5X5) (QFN, 32-Leads, Body 5.2x5.2mm (max), Pitch 0.50mm, IPC Medium Density)
pins: 1 VSS (power) "Ground reference", 2 XOUT "Output terminal of crystal oscillator", 3 XIN "Input terminal of crystal oscillator", 4 NC "Not connected internally. Recommended connection to VSS.", 5 ~{RST}/NMI (in), 6 P2.0/ACLK/A0 (io), 7 P2.1/INCLK/A1 (io), 8 P2.2/TA0/A2 (io), 9 P3.0/STE0/A5 (io), 10 P3.1/SIMO0 (io), 11 P3.2/SOMI0 (io), 12 P3.3/UCLK0 (io), 13 P3.4/UTXD0 (io), 14 P3.5/URXD0 (io), 15 P3.6/A6 (io), 16 P3.7/A7 (io), 17 NC "Not connected internally. Recommended connection to VSS.", 18 P2.3/TA1/A3/VREF-/VEREF- (io), 19 P2.4/TA2/A4/VREF+/VEREF+ (io), 20 NC "Not connected internally. Recommended connection to VSS.", 21 P1.0/TACLK/ADC10CLK (io), 22 P1.1/TA0 (io), 23 P1.2/TA1 (io), 24 P1.3/TA2 (io), 25 P1.4/SMCLK/TCK (io), 26 P1.5/TA0/TMS (io), 27 P1.6/TA1/TDI/TCLK (io), 28 P1.7/TA2/TDO/TDI (io), 29 TEST (in) "Selects test mode for JTAG pins on P1.x", 30 VCC (power) "Supply voltage", 31 NC "Not connected internally. Recommended connection to VSS.", 32 P2.5/ROSC (io), 33 QFN PAD (power) "QFN package pad connection to VSS recommended."

## MSP430F2011IPW
designator U?
Integrated Circuit; Manufacturer_Name: Texas Instruments; Manufacturer_Part_Number: MSP430F2011IPW; Datasheet Link: http://www.ti.com/lit/ds/symlink/msp430f2011.pdf; Height: 1.2mm; Mouser Part Number: 595-MSP430F2011IPW; Mouser Price/Stock: https://www.mouser.com/Search/Refine.aspx?Keyword=595-MSP430F2011IPW; RS Part Number: 1627275; RS Price/Stock: http://uk.rs-online.com/web/p/products/1627275
footprint TSSOP14_0.65 (TSOP, 14-Leads, Body 5.00x4.40mm, Pitch 0.65mm, Thermal Pad 2.31x2.46mm, IPC Low Density)
pins: 1 VCC (power) "Supply voltage", 2 P1.0/TACLK/ACLK/CA0 (io), 3 P1.1/TA0/CA1 (io), 4 P1.2/TA1/CA2 (io), 5 P1.3/CAOUT/CA3 (io), 6 P1.4/SMCLK/CA4/TCK (io), 7 P1.5/TA0/CA5/TMS (io), 8 P1.6/TA1/CA6/TDI/TCLK (io), 9 P1.7/CAOUT/CA7/TDO/TDI (io), 10 ~{RST}/NMI/SBWTDIO (io), 11 TEST/SBWTCK (in), 12 P2.7/XOUT (io), 13 P2.6/XIN/TA1 (io), 14 VSS (power) "Ground reference"

## MSP430F2011IRSAT
designator U?
Integrated Circuit; Manufacturer_Name: Texas Instruments; Manufacturer_Part_Number: MSP430F2011IRSAT; Datasheet Link: http://www.ti.com/lit/gpn/msp430f2011
footprint QFN16_0.65-PAD(4x4) (QFN, 16-Leads, Body 3.0x3.0mm (max), Pitch 0.50mm, IPC Low Density)
pins: 1 P1.0/TACLK/ACLK/CA0 (io), 2 P1.1/TA0/CA1 (io), 3 P1.2/TA1/CA2 (io), 4 P1.3/CAOUT/CA3 (io), 5 P1.4/SMCLK/CA4/TCK (io), 6 P1.5/TA0/CA5/TMS (io), 7 P1.6/TA1/CA6/TDI/TCLK (io), 8 P1.7/CAOUT/CA7/TDO/TDI (io), 9 ~{RST}/NMI/SBWTDIO (io), 10 TEST/SBWTCK (in), 11 P2.7/XOUT (io), 12 P2.6/XIN/TA1 (io), 13 NC "Not connected", 14 VSS (power) "Ground reference", 15 NC "Not connected", 16 VCC (power) "Supply voltage", 17 QFN PAD (power) "QFN package pad. Connection to VSS is recommended."